# Altium footprint library klp.PcbLib: 436 footprints (part 18 of 28)
Each footprint in its own frame and in the unit in brackets; x right, y up, seen from the top. Pads: shape width x height; smd on the part's side, far side on the other; paste and mask are expansions set on the pad; w line width, h text height; cw(c..) or ccw(c..) is an arc to the next point about the centre after c.
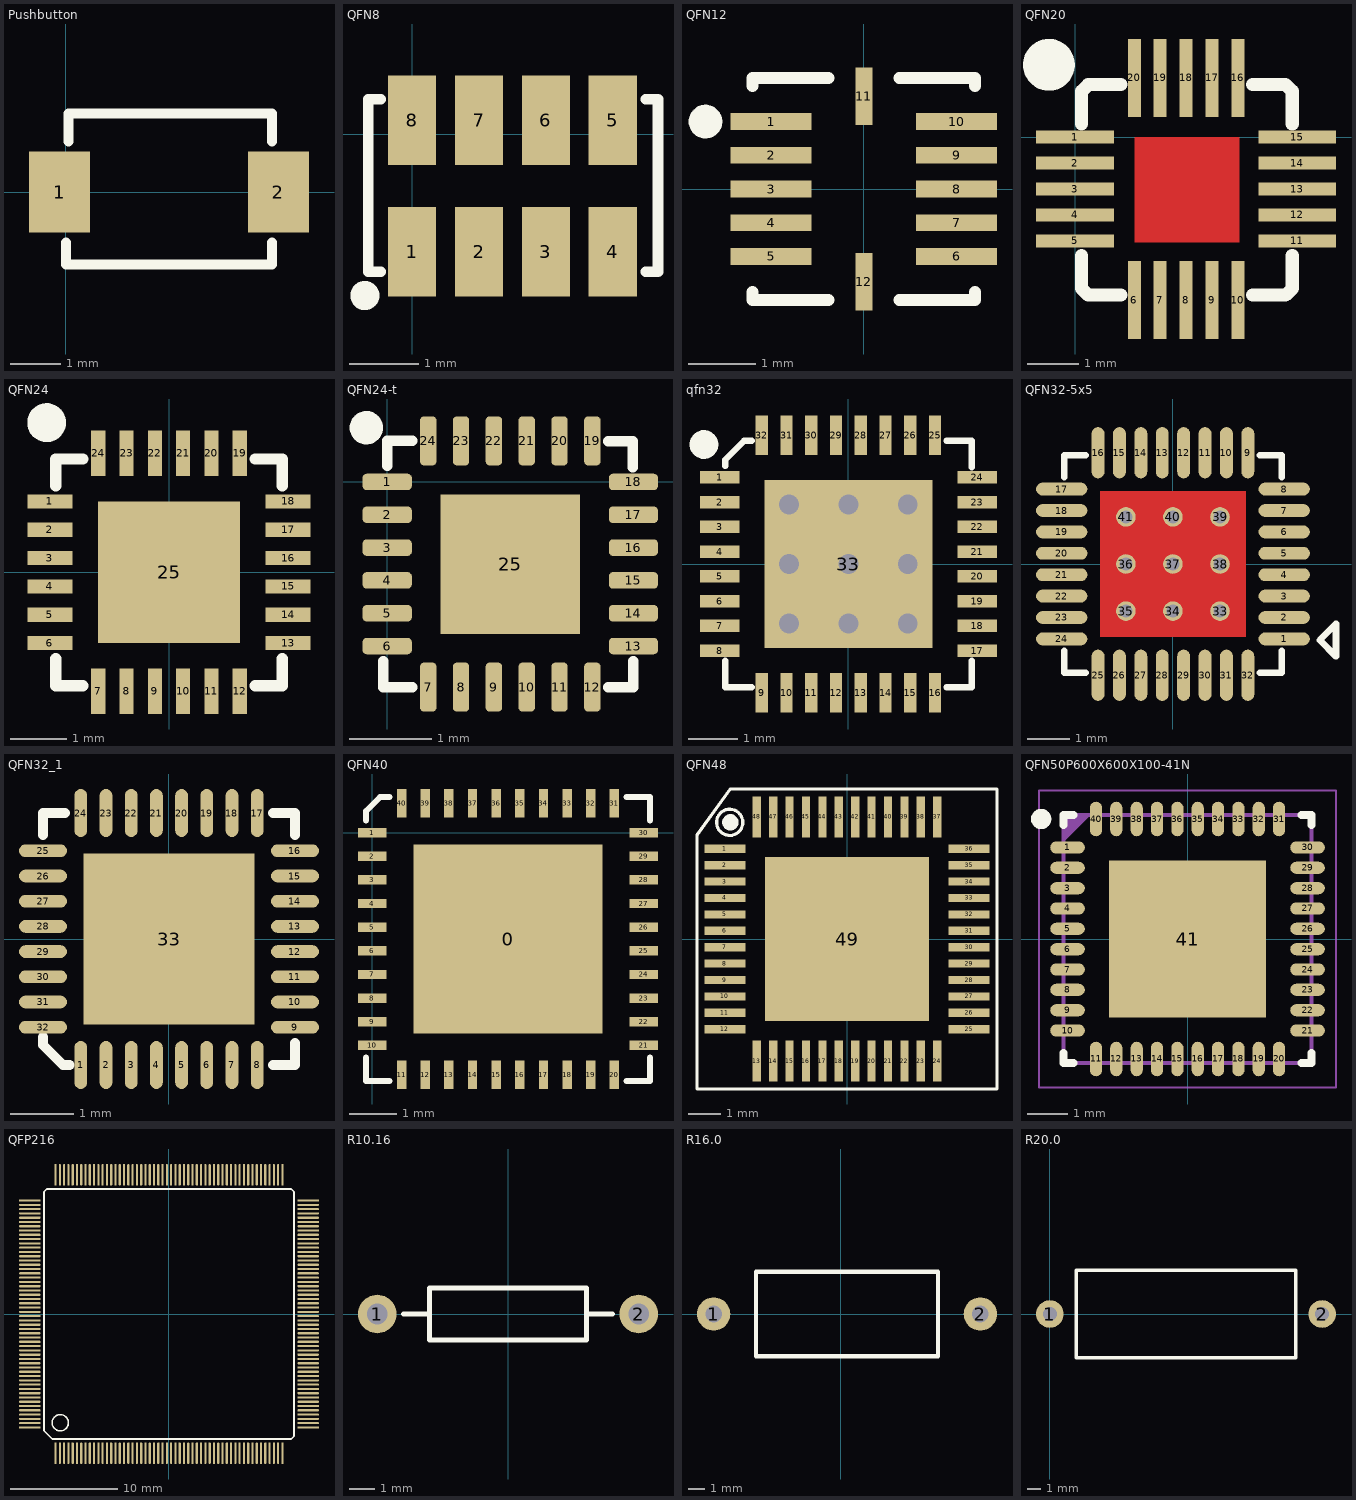
[diagram p17: the footprints below, top view; thin cyan lines are the x and y axes]

## Pushbutton [mm] "3 * 4 * 2mm SMD"
pads (2):
  rect 1.2x1.6 smd: 1(-0.125,0) 2(4.2,0)
Top Overlay:
  lines w0.2: 0,-1 0,-1.425 4.075,-1.425 4.075,-1 ; 0.05,1 0.05,1.55 4.075,1.55 4.075,1
3D body "User Library-Pushbutton3x4x2.step": height 2, standoff 0, extent -0.4,-1.425 4.5,1.475

## QFN8 [mm]
pads (8):
  rect 0.7x1.3 smd: 1(0,-1.703) 2(0.97,-1.703) 3(1.94,-1.703) 4(2.91,-1.703) 5(2.91,0.203) 6(1.94,0.203) 7(0.97,0.203) 8(0,0.203)
Top Overlay:
  circle w0.224: c-0.684,-2.337 r0.1
  lines w0.152: -0.457,-1.992 -0.635,-1.992 -0.635,0.508 -0.457,0.508 ; 3.387,-1.992 3.565,-1.992 3.565,0.508 3.387,0.508

## QFN12 [mm] "QFN, 12-Leads, Body 3.2x3.2mm (max), Pitch 0.50mm, IPC High Density"
height 0.9
pads (12):
  rect 1.2x0.25 smd: 1(-1.375,1) 2(-1.375,0.5) 3(-1.375,0) 4(-1.375,-0.5) 5(-1.375,-1) 6(1.375,-1) 7(1.375,-0.5) 8(1.375,0) 9(1.375,0.5) 10(1.375,1)
  rect 0.25x0.85 smd: 11(0,1.375) 12(0,-1.375)
Top Overlay:
  circle w0.25: c-2.35,1 r0.125
  lines w0.178: -1.65,-1.525 -1.65,-1.65 -0.525,-1.65 ; -1.65,1.525 -1.65,1.65 -0.525,1.65 ; 0.525,-1.65 1.65,-1.65 1.65,-1.525 ; 0.525,1.65 1.65,1.65 1.65,1.525

## QFN20 [mm]
height 1
pads (20):
  rect 1.5x0.25 smd: 1(0,0) 2(0,-0.5) 3(0,-1) 4(0,-1.5) 5(0,-2) 11(4.286,-2) 12(4.286,-1.5) 13(4.286,-1) 14(4.286,-0.5) 15(4.286,0)
  rect 0.25x1.5 smd: 6(1.143,-3.143) 7(1.643,-3.143) 8(2.143,-3.143) 9(2.643,-3.143) 10(3.143,-3.143) 16(3.143,1.143) 17(2.643,1.143) 18(2.143,1.143) 19(1.643,1.143) 20(1.143,1.143)
Top Layer:
  rectangle: 1.143,-2.032 3.175,0
Top Overlay:
  circle w0.5: c-0.504,1.397 r0.25
  lines w0.254: 0.127,-2.286 0.127,-2.921 0.254,-3.048 0.889,-3.048 0.381,-3.048 ; 0.127,0.254 0.127,0.889 0.254,1.016 0.889,1.016 0.381,1.016 ; 3.429,-3.048 4.064,-3.048 4.191,-2.921 4.191,-2.286 ; 3.937,1.016 3.429,1.016 4.064,1.016 4.191,0.889 4.191,0.254

## QFN24 [mm]
pads (25):
  rect 0.8x0.25 smd: 1(-2.101,1.25) 2(-2.101,0.75) 3(-2.101,0.25) 4(-2.101,-0.25) 5(-2.101,-0.75) 6(-2.101,-1.25) 13(2.101,-1.25) 14(2.101,-0.75) 15(2.101,-0.25) 16(2.101,0.25) 17(2.101,0.75) 18(2.101,1.25)
  rect 0.25x0.8 smd: 7(-1.25,-2.101) 8(-0.75,-2.101) 9(-0.25,-2.101) 10(0.25,-2.101) 11(0.75,-2.101) 12(1.25,-2.101) 19(1.25,2.101) 20(0.75,2.101) 21(0.25,2.101) 22(-0.25,2.101) 23(-0.75,2.101) 24(-1.25,2.101)
  rect 2.5x2.5 smd: 25(0,0)
Top Overlay:
  circle w0.381: c-2.159,2.642 r0.152
  lines w0.2: -2,-1.525 -2,-2 -1.525,-2 ; -2,1.525 -2,2 -1.525,2 ; 1.525,-2 2,-2 2,-1.525 ; 1.525,2 2,2 2,1.525
3D body "User Library-QFN 24 4x4.step": height 0.9, standoff 0, extent -2.002,-2.002 2.002,2.002

## QFN24-t [mm]
pads (25):
  rrect50% 0.6x0.2 smd: 1(0,0) 2(0,-0.4) 3(0,-0.8) 4(0,-1.2) 5(0,-1.6) 6(0,-2) 13(3,-2) 14(3,-1.6) 15(3,-1.2) 16(3,-0.8) 17(3,-0.4) 18(3,0)
  rrect50% 0.2x0.6 smd: 7(0.5,-2.5) 8(0.9,-2.5) 9(1.3,-2.5) 10(1.7,-2.5) 11(2.1,-2.5) 12(2.5,-2.5) 19(2.5,0.5) 20(2.1,0.5) 21(1.7,0.5) 22(1.3,0.5) 23(0.9,0.5) 24(0.5,0.5)
  rect 1.7x1.7 smd: 25(1.499,-1.003)
Top Overlay:
  circle w0.203: c-0.254,0.66 r0.102
  lines w0.127: -0.047,-2.184 -0.047,-2.5 0.305,-2.5 ; 0,0.199 0,0.5 0.305,0.5 ; 2.692,-2.5 3,-2.5 3,-2.184 ; 2.692,0.495 2.993,0.495 ; 2.993,0.178 2.993,0.483

## qfn32 [mm]
pads (33):
  rect 0.8x0.25 smd: 1(-2.601,1.75) 2(-2.601,1.25) 3(-2.601,0.75) 4(-2.601,0.25) 5(-2.601,-0.25) 6(-2.601,-0.75) 7(-2.601,-1.25) 8(-2.601,-1.75) 17(2.601,-1.75) 18(2.601,-1.25) 19(2.601,-0.75) 20(2.601,-0.25) 21(2.601,0.25) 22(2.601,0.75) 23(2.601,1.25) 24(2.601,1.75)
  rect 0.25x0.8 smd: 9(-1.75,-2.601) 10(-1.25,-2.601) 11(-0.75,-2.601) 12(-0.25,-2.601) 13(0.25,-2.601) 14(0.75,-2.601) 15(1.25,-2.601) 16(1.75,-2.601) 25(1.75,2.601) 26(1.25,2.601) 27(0.75,2.601) 28(0.25,2.601) 29(-0.25,2.601) 30(-0.75,2.601) 31(-1.25,2.601) 32(-1.75,2.601)
  rect 3.4x3.4 smd: 33(0,0)
via 1.2,-1.2 diameter 0.7 hole 0.4
via 0,-1.2 diameter 0.7 hole 0.4
via -1.2,-1.2 diameter 0.7 hole 0.4
via 1.2,0 diameter 0.7 hole 0.4
via 0,0 diameter 0.7 hole 0.4
via -1.2,0 diameter 0.7 hole 0.4
via 1.2,1.2 diameter 0.7 hole 0.4
via 0,1.2 diameter 0.7 hole 0.4
via -1.2,1.2 diameter 0.7 hole 0.4
Top Overlay:
  circle w0.3: c-2.919,2.413 r0.14
  lines w0.127: -2.489,-1.956 -2.489,-2.489 -1.956,-2.489 ; -2.489,1.981 -2.489,2.108 -2.108,2.489 -1.956,2.489 ; 1.981,-2.489 2.489,-2.489 2.489,-1.956 ; 1.981,2.489 2.489,2.489 2.489,1.956
Mechanical 15:
  lines w0.1: -0.5,0 0.5,0 ; 0,-0.5 0,0.5

## QFN32-5x5 [mm] "5X5mm"
pads (41):
  oval 1.2x0.3 smd: 1(2.6,-1.75) 2(2.6,-1.25) 3(2.6,-0.75) 4(2.6,-0.25) 5(2.6,0.25) 6(2.6,0.75) 7(2.6,1.25) 8(2.6,1.75) 17(-2.6,1.75) 18(-2.6,1.25) 19(-2.6,0.75) 20(-2.6,0.25) 21(-2.6,-0.25) 22(-2.6,-0.75) 23(-2.6,-1.25) 24(-2.6,-1.75)
  oval 0.3x1.2 smd: 9(1.75,2.6) 10(1.25,2.6) 11(0.75,2.6) 12(0.25,2.6) 13(-0.25,2.6) 14(-0.75,2.6) 15(-1.25,2.6) 16(-1.75,2.6) 25(-1.75,-2.6) 26(-1.25,-2.6) 27(-0.75,-2.6) 28(-0.25,-2.6) 29(0.25,-2.6) 30(0.75,-2.6) 31(1.25,-2.6) 32(1.75,-2.6)
  round 0.457 hole 0.305: 33(1.1,-1.1) 34(0,-1.1) 35(-1.1,-1.1) 36(-1.1,0) 37(0,0) 38(1.1,0) 39(1.1,1.1) 40(0,1.1) 41(-1.1,1.1)
Top Layer:
  region: 1.7,-1.7 -1.7,-1.7 -1.7,1.7 1.7,1.7
Top Overlay:
  lines w0.152: -2.54,-2.032 -2.54,-2.54 -2.032,-2.54 ; -2.54,2.032 -2.54,2.54 -2.032,2.54 ; 2.032,-2.54 2.54,-2.54 2.54,-2.032 ; 2.032,2.54 2.54,2.54 2.54,2.032 ; 3.429,-1.778 3.81,-1.397 3.81,-2.159 3.429,-1.778
3D body "User Library-qfn32-5x5.step": height 0.8, standoff 0, extent -2.51,-2.51 2.51,2.51

## QFN32_1 [mil] "4X4mm"
pads (33):
  oval 8x30 smd: 1(-55.12,-78.74) 2(-39.37,-78.74) 3(-23.62,-78.74) 4(-7.87,-78.74) 5(7.87,-78.74) 6(23.62,-78.74) 7(39.37,-78.74) 8(55.12,-78.74) 17(55.12,78.74) 18(39.37,78.74) 19(23.62,78.74) 20(7.87,78.74) 21(-7.87,78.74) 22(-23.62,78.74) 23(-39.37,78.74) 24(-55.12,78.74)
  oval 30x8 smd: 9(78.74,-55.12) 10(78.74,-39.37) 11(78.74,-23.62) 12(78.74,-7.87) 13(78.74,7.87) 14(78.74,23.62) 15(78.74,39.37) 16(78.74,55.12) 25(-78.74,55.12) 26(-78.74,39.37) 27(-78.74,23.62) 28(-78.74,7.87) 29(-78.74,-7.87) 30(-78.74,-23.62) 31(-78.74,-39.37) 32(-78.74,-55.12)
  rect 107x107 smd: 33(0,0)
Top Overlay:
  lines w6: -78.74,-61.13 -78.74,-66.24 -66.24,-78.74 -62,-78.74 ; -78.74,65 -78.74,78.74 -65,78.74 ; 65,-78.74 78.74,-78.74 78.74,-65 ; 65,78.74 78.74,78.74 78.74,65
3D body "User Library-QFN 32.step": height 22.25, standoff -1.38, extent -78.78,-78.78 78.78,78.78

## QFN40 [mm]
pads (41):
  rect 4x4 smd: 0(2.87,-2.25)
  rect 0.6x0.2 smd: 1(0,0) 2(0,-0.5) 3(0,-1) 4(0,-1.5) 5(0,-2) 6(0,-2.5) 7(0,-3) 8(0,-3.5) 9(0,-4) 10(0,-4.5) 21(5.74,-4.5) 22(5.74,-4) 23(5.74,-3.5) 24(5.74,-3) 25(5.74,-2.5) 26(5.74,-2) 27(5.74,-1.5) 28(5.74,-1) 29(5.74,-0.5) 30(5.74,0)
  rect 0.2x0.6 smd: 11(0.62,-5.12) 12(1.12,-5.12) 13(1.62,-5.12) 14(2.12,-5.12) 15(2.62,-5.12) 16(3.12,-5.12) 17(3.62,-5.12) 18(4.12,-5.12) 19(4.62,-5.12) 20(5.12,-5.12) 31(5.12,0.62) 32(4.62,0.62) 33(4.12,0.62) 34(3.62,0.62) 35(3.12,0.62) 36(2.62,0.62) 37(2.12,0.62) 38(1.62,0.62) 39(1.12,0.62) 40(0.62,0.62)
Top Overlay:
  lines w0.127: -0.13,-4.75 -0.13,-5.25 0.37,-5.25 ; -0.13,0.25 -0.13,0.45 0.17,0.75 0.37,0.75 ; 5.37,-5.25 5.87,-5.25 5.87,-4.75 ; 5.37,0.75 5.87,0.75 5.87,0.25

## QFN48 [mm] "QFN, 48-Leads, Body 7.0x7.0mm (max), Pitch 0.50mm, IPC Low Density"
height 0.8
pads (49):
  rect 1.25x0.25 smd: 1(-3.725,2.75) 2(-3.725,2.25) 3(-3.725,1.75) 4(-3.725,1.25) 5(-3.725,0.75) 6(-3.725,0.25) 7(-3.725,-0.25) 8(-3.725,-0.75) 9(-3.725,-1.25) 10(-3.725,-1.75) 11(-3.725,-2.25) 12(-3.725,-2.75) 25(3.725,-2.75) 26(3.725,-2.25) 27(3.725,-1.75) 28(3.725,-1.25) 29(3.725,-0.75) 30(3.725,-0.25) 31(3.725,0.25) 32(3.725,0.75) 33(3.725,1.25) 34(3.725,1.75) 35(3.725,2.25) 36(3.725,2.75)
  rect 0.25x1.25 smd: 13(-2.75,-3.725) 14(-2.25,-3.725) 15(-1.75,-3.725) 16(-1.25,-3.725) 17(-0.75,-3.725) 18(-0.25,-3.725) 19(0.25,-3.725) 20(0.75,-3.725) 21(1.25,-3.725) 22(1.75,-3.725) 23(2.25,-3.725) 24(2.75,-3.725) 37(2.75,3.725) 38(2.25,3.725) 39(1.75,3.725) 40(1.25,3.725) 41(0.75,3.725) 42(0.25,3.725) 43(-0.25,3.725) 44(-0.75,3.725) 45(-1.25,3.725) 46(-1.75,3.725) 47(-2.25,3.725) 48(-2.75,3.725)
  rect 5x5 smd: 49(0,0)
Top Overlay:
  circle w0.25: c-3.554,3.556 r0.125
  circle w0.1: c-3.575,3.556 r0.4
  lines w0.1: -4.572,-4.572 -4.572,-0.508 -4.572,3.175 -3.556,4.572 4.572,4.572 4.572,-4.572 -4.572,-4.572
Mechanical 15:
  lines w0.1: -0.5,0 0.5,0 ; 0,-0.5 0,0.5
3D body: height 0.8, standoff 0.01, extent -3.5,-3.5 3.5,3.5

## QFN50P600X600X100-41N [mm]
pads (41):
  oval 0.85x0.3 smd: 1(-2.95,2.25) 2(-2.95,1.75) 3(-2.95,1.25) 4(-2.95,0.75) 5(-2.95,0.25) 6(-2.95,-0.25) 7(-2.95,-0.75) 8(-2.95,-1.25) 9(-2.95,-1.75) 10(-2.95,-2.25) 21(2.95,-2.25) 22(2.95,-1.75) 23(2.95,-1.25) 24(2.95,-0.75) 25(2.95,-0.25) 26(2.95,0.25) 27(2.95,0.75) 28(2.95,1.25) 29(2.95,1.75) 30(2.95,2.25)
  oval 0.3x0.85 smd: 11(-2.25,-2.95) 12(-1.75,-2.95) 13(-1.25,-2.95) 14(-0.75,-2.95) 15(-0.25,-2.95) 16(0.25,-2.95) 17(0.75,-2.95) 18(1.25,-2.95) 19(1.75,-2.95) 20(2.25,-2.95) 31(2.25,2.95) 32(1.75,2.95) 33(1.25,2.95) 34(0.75,2.95) 35(0.25,2.95) 36(-0.25,2.95) 37(-0.75,2.95) 38(-1.25,2.95) 39(-1.75,2.95) 40(-2.25,2.95)
  rect 3.85x3.85 smd: 41(0,0)
Top Overlay:
  circle w0.25: c-3.6,2.95 r0.125
  lines w0.2: -3.05,-2.8 -3.05,-3.05 -2.8,-3.05 ; -3.05,2.8 -3.05,3.05 -2.8,3.05 ; 2.8,-3.05 3.05,-3.05 3.05,-2.8 ; 2.8,3.05 3.05,3.05 3.05,2.8
Top Paste:
  region: -1.155,1.155 1.155,1.155 1.155,-1.155 -1.155,-1.155
Mechanical 15:
  lines w0.1: -3.05,2.45 -2.45,3.05 ; -3.05,2.55 -2.55,3.05 ; -3.05,2.65 -2.65,3.05 ; -3.05,2.75 -2.75,3.05 ; -3.05,2.85 -2.85,3.05 ; -3.05,2.95 -2.95,3.05 ; -3.05,-3.05 -3.05,3.05 3.05,3.05 3.05,-3.05 -3.05,-3.05
  text "1" at -0.164,-0.45 h0.75
Mechanical 16:
  lines w0.001: -3.05,-3.05 -3.05,3.05 3.05,3.05 3.05,-3.05 -3.05,-3.05
  lines w0.05: -0.5,0 0.5,0 ; 0,-0.5 0,0.5 ; -3.65,-3.65 -3.65,3.65 3.65,3.65 3.65,-3.65 -3.65,-3.65

## QFP216 [mil]
pads (216):
  oval 8x80 smd: 1(-417.32,-511.81) 2(-401.57,-511.81) 3(-385.83,-511.81) 4(-370.08,-511.81) 5(-354.33,-511.81) 6(-338.58,-511.81) 7(-322.83,-511.81) 8(-307.09,-511.81) 9(-291.34,-511.81) 10(-275.59,-511.81) 11(-259.84,-511.81) 12(-244.09,-511.81) 13(-228.35,-511.81) 14(-212.6,-511.81) 15(-196.85,-511.81) 16(-181.1,-511.81) 17(-165.35,-511.81) 18(-149.61,-511.81) 19(-133.86,-511.81) 20(-118.11,-511.81) 21(-102.36,-511.81) 22(-86.61,-511.81) 23(-70.87,-511.81) 24(-55.12,-511.81) 25(-39.37,-511.81) 26(-23.62,-511.81) 27(-7.87,-511.81) 28(7.87,-511.81) 29(23.62,-511.81) 30(39.37,-511.81) 31(55.12,-511.81) 32(70.87,-511.81) 33(86.61,-511.81) 34(102.36,-511.81) 35(118.11,-511.81) 36(133.86,-511.81) 37(149.61,-511.81) 38(165.35,-511.81) 39(181.1,-511.81) 40(196.85,-511.81) 41(212.6,-511.81) 42(228.35,-511.81) 43(244.09,-511.81) 44(259.84,-511.81) 45(275.59,-511.81) 46(291.34,-511.81) 47(307.09,-511.81) 48(322.83,-511.81) 49(338.58,-511.81) 50(354.33,-511.81) 51(370.08,-511.81) 52(385.83,-511.81) 53(401.57,-511.81) 54(417.32,-511.81) 109(417.32,511.81) 110(401.57,511.81) 111(385.83,511.81) 112(370.08,511.81) 113(354.33,511.81) 114(338.58,511.81) 115(322.83,511.81) 116(307.09,511.81) 117(291.34,511.81) 118(275.59,511.81) 119(259.84,511.81) 120(244.09,511.81) 121(228.35,511.81) 122(212.6,511.81) 123(196.85,511.81) 124(181.1,511.81) 125(165.35,511.81) 126(149.61,511.81) 127(133.86,511.81) 128(118.11,511.81) 129(102.36,511.81) 130(86.61,511.81) 131(70.87,511.81) 132(55.12,511.81) 133(39.37,511.81) 134(23.62,511.81) 135(7.87,511.81) 136(-7.87,511.81) 137(-23.62,511.81) 138(-39.37,511.81) 139(-55.12,511.81) 140(-70.87,511.81) 141(-86.61,511.81) 142(-102.36,511.81) 143(-118.11,511.81) 144(-133.86,511.81) 145(-149.61,511.81) 146(-165.35,511.81) 147(-181.1,511.81) 148(-196.85,511.81) 149(-212.6,511.81) 150(-228.35,511.81) 151(-244.09,511.81) 152(-259.84,511.81) 153(-275.59,511.81) 154(-291.34,511.81) 155(-307.09,511.81) 156(-322.83,511.81) 157(-338.58,511.81) 158(-354.33,511.81) 159(-370.08,511.81) 160(-385.83,511.81) 161(-401.57,511.81) 162(-417.32,511.81)
  oval 80x8 smd: 55(511.81,-417.32) 56(511.81,-401.57) 57(511.81,-385.83) 58(511.81,-370.08) 59(511.81,-354.33) 60(511.81,-338.58) 61(511.81,-322.83) 62(511.81,-307.09) 63(511.81,-291.34) 64(511.81,-275.59) 65(511.81,-259.84) 66(511.81,-244.09) 67(511.81,-228.35) 68(511.81,-212.6) 69(511.81,-196.85) 70(511.81,-181.1) 71(511.81,-165.35) 72(511.81,-149.61) 73(511.81,-133.86) 74(511.81,-118.11) 75(511.81,-102.36) 76(511.81,-86.61) 77(511.81,-70.87) 78(511.81,-55.12) 79(511.81,-39.37) 80(511.81,-23.62) 81(511.81,-7.87) 82(511.81,7.87) 83(511.81,23.62) 84(511.81,39.37) 85(511.81,55.12) 86(511.81,70.87) 87(511.81,86.61) 88(511.81,102.36) 89(511.81,118.11) 90(511.81,133.86) 91(511.81,149.61) 92(511.81,165.35) 93(511.81,181.1) 94(511.81,196.85) 95(511.81,212.6) 96(511.81,228.35) 97(511.81,244.09) 98(511.81,259.84) 99(511.81,275.59) 100(511.81,291.34) 101(511.81,307.09) 102(511.81,322.83) 103(511.81,338.58) 104(511.81,354.33) 105(511.81,370.08) 106(511.81,385.83) 107(511.81,401.57) 108(511.81,417.32) 163(-511.81,417.32) 164(-511.81,401.57) 165(-511.81,385.83) 166(-511.81,370.08) 167(-511.81,354.33) 168(-511.81,338.58) 169(-511.81,322.83) 170(-511.81,307.09) 171(-511.81,291.34) 172(-511.81,275.59) 173(-511.81,259.84) 174(-511.81,244.09) 175(-511.81,228.35) 176(-511.81,212.6) 177(-511.81,196.85) 178(-511.81,181.1) 179(-511.81,165.35) 180(-511.81,149.61) 181(-511.81,133.86) 182(-511.81,118.11) 183(-511.81,102.36) 184(-511.81,86.61) 185(-511.81,70.87) 186(-511.81,55.12) 187(-511.81,39.37) 188(-511.81,23.62) 189(-511.81,7.87) 190(-511.81,-7.87) 191(-511.81,-23.62) 192(-511.81,-39.37) 193(-511.81,-55.12) 194(-511.81,-70.87) 195(-511.81,-86.61) 196(-511.81,-102.36) 197(-511.81,-118.11) 198(-511.81,-133.86) 199(-511.81,-149.61) 200(-511.81,-165.35) 201(-511.81,-181.1) 202(-511.81,-196.85) 203(-511.81,-212.6) 204(-511.81,-228.35) 205(-511.81,-244.09) 206(-511.81,-259.84) 207(-511.81,-275.59) 208(-511.81,-291.34) 209(-511.81,-307.09) 210(-511.81,-322.83) 211(-511.81,-338.58) 212(-511.81,-354.33) 213(-511.81,-370.08) 214(-511.81,-385.83) 215(-511.81,-401.57) 216(-511.81,-417.32)
Top Overlay:
  circle w6: c-400,-400 r30
  lines w6: -460,-430 -430,-460 450,-460 460,-450 460,450 450,460 -450,460 -460,450 -460,-430
3D body "User Library-IPC QFP-full.step": height 68.9, standoff 0, extent -512.08,-512.21 512.42,512.29

## R10.16 [mm] "STD"
height 4
pads (2):
  round 1.5 hole 0.8: 1(-5.08,0) 2(5.08,0)
Top Overlay:
  lines w0.2: -4.064,0 -3.048,0 ; 3.048,0 4.064,0 ; -3.048,-1.016 -3.048,1.016 3.048,1.016 3.048,-1.016 -3.048,-1.016

## R16.0 [mm] "RX/1W"
pads (2):
  round 2 hole 1: 1(-7.62,0) 2(8.382,0)
Top Overlay:
  lines w0.254: -5.08,-2.54 5.842,-2.54 5.842,2.54 -5.08,2.54 -5.08,-2.54

## R20.0 [mm] "RX/2W"
height 7
pads (2):
  round 2 hole 1: 1(0,0) 2(19.685,0)
Top Overlay:
  lines w0.254: 1.905,-3.175 1.905,3.175 17.78,3.175 17.78,-3.175 1.905,-3.175